# Altium footprint library 00.PcbLib: 150 footprints (part 10 of 10)
Each footprint in its own frame and in the unit in brackets; x right, y up, seen from the top. Pads: shape width x height; smd on the part's side, far side on the other; paste and mask are expansions set on the pad; w line width, h text height; cw(c..) or ccw(c..) is an arc to the next point about the centre after c.
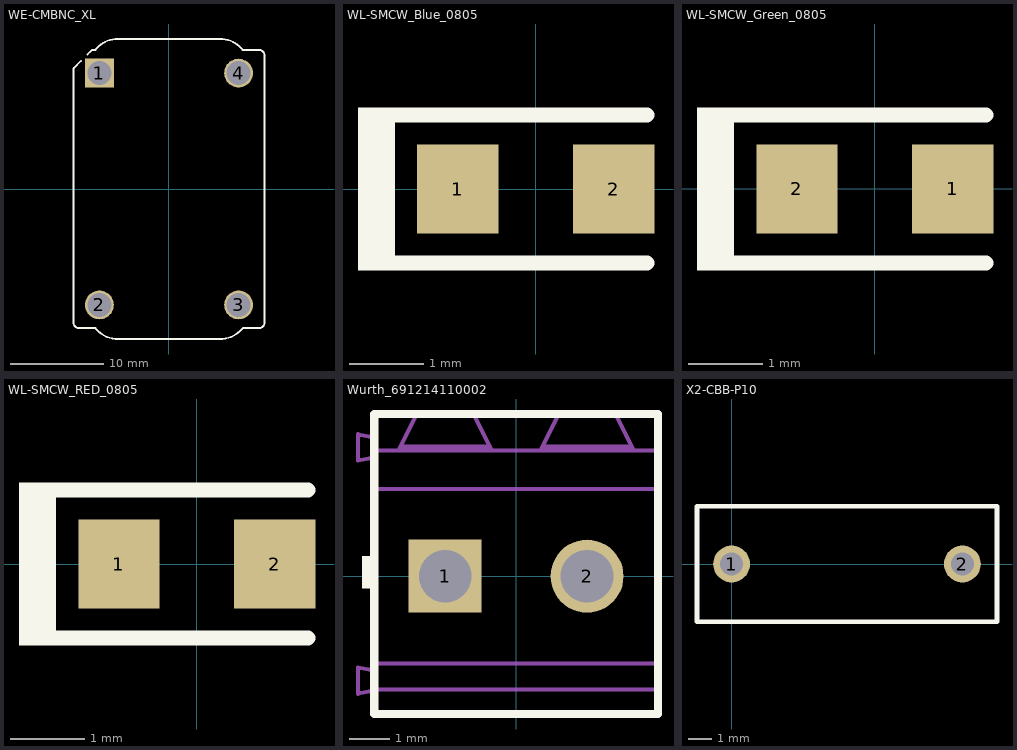
[diagram p9: the footprints below, top view; thin cyan lines are the x and y axes]

## WE-CMBNC_XL [mm]
pads (4):
  rect 3.1x3.1 hole 2.6: 1(-7.5,12.5)
  round 3.1 hole 2.6: 2(-7.5,-12.5) 3(7.5,-12.5) 4(7.5,12.5)
Top Overlay:
  lines w0.2: -9.5,13.8 -10.212,13.088 ccw(c-10,12.876) -10.3,12.876 -10.3,-14.4 ccw(c-9.7,-14.4) -9.7,-15 -7.939,-15 ; -8.8,14.5 -8.388,14.912 cw(c-8.176,14.7) -8.176,15 -7.939,15 ; -7.978,14.978 cw(c-5.531,13.066) -5.5,16.171 5.5,16.171 cw(c5.531,13.066) 7.978,14.978 ; -7.885,-15.064 ccw(c-5.513,-13.073) -5.5,-16.171 5.5,-16.171 ccw(c5.513,-13.073) 7.885,-15.064 ; 7.966,-15 9.7,-15 ccw(c9.7,-14.4) 10.3,-14.4 ; 7.966,15 9.7,15 cw(c9.7,14.4) 10.3,14.4 10.3,-14.4
3D body "7448052303.stp": height 30.09, standoff -6, extent -10.3,-16.169 10.3,16.17

## WL-SMCW_Blue_0805 [mm]
pads (2):
  rect 1.1x1.2 smd: 1(-1.05,0) 2(1.05,0)
Top Overlay:
  rectangle: -2.398,-1.1 -1.998,1.1
  lines w0.2: 1.5,-1 -2,-1 -2,1 1.5,1
3D body "WL-SMCW_0805.stp": height 0.7, standoff 0, extent -1,-0.625 1,0.625

## WL-SMCW_Green_0805 [mm]
pads (2):
  rect 1.1x1.2 smd: 1(1.05,0) 2(-1.05,0)
Top Overlay:
  rectangle: -2.4,-1.101 -2,1.099
  lines w0.2: 1.5,-1 -2,-1 -2,1 1.5,1
3D body "WL-SMCW_0805.stp": height 0.7, standoff 0, extent -1,-0.625 1,0.625

## WL-SMCW_RED_0805 [mm]
pads (2):
  rect 1.1x1.2 smd: 1(-1.05,0) 2(1.05,0)
Top Overlay:
  rectangle: -2.4,-1.1 -2,1.1
  lines w0.2: 1.5,-1 -2,-1 -2,1 1.5,1
3D body "WL-SMCW_0805.stp": height 0.7, standoff 0, extent -1,-0.625 1,0.625

## Wurth_691214110002 [mm]
pads (2):
  rect 1.8x1.8 hole 1.3: 1(-1.75,0)
  round 1.8 hole 1.3: 2(1.75,0)
Top Overlay:
  rectangle: -3.8,-0.3 -3.5,0.5
  lines w0.2: -3.5,-3.4 -3.5,-2.8 -3.5,-2.15 -3.5,2.15 -3.5,3.1 -3.5,4 -2.45,4 -1.05,4 1.05,4 2.45,4 3.5,4 3.5,3.1 3.5,2.15 3.5,-2.15 3.5,-2.8 3.5,-3.4 -3.5,-3.4
Top Component Outline (Mech100):
  lines w0.1: -3.5,-2.825 -3.9,-2.9 -3.9,-2.25 -3.5,-2.325 ; -3.5,2.925 -3.9,2.85 -3.9,3.5 -3.5,3.425 ; -2.85,3.2 -2.8,3.2 ; -2.8,3.1 -2.8,3.2 ; -2.5,3.1 -2.5,3.2 ; -1.1,3.1 -1.1,3.2 ; -0.8,3.1 -0.8,3.2 ; -0.65,3.2 -0.8,3.2 ; 0.65,3.2 0.7,3.2 ; 0.7,3.1 0.7,3.2 ; 1,3.1 1,3.2 ; 2.4,3.1 2.4,3.2 ; 2.7,3.1 2.7,3.2 ; 2.85,3.2 2.7,3.2 ; -3.5,-2.8 3.5,-2.8 ; -3.5,-2.8 -3.5,-2.15 ; -3.5,-2.8 -3.5,-3.4 3.5,-3.4 3.5,-2.8 ; -3.5,-2.15 3.5,-2.15 ; -3.5,-2.15 -3.5,2.15 ; -3.5,2.15 3.5,2.15 ; -3.5,2.15 -3.5,3.1 ; -3.5,3.1 -2.9,3.1 ; -3.5,3.1 -3.5,4 -2.45,4 ; -2.9,3.1 -0.6,3.1 ; -2.9,3.1 -2.45,4 ; -2.8,3.2 -2.6,3.2 -2.5,3.2 ; -2.5,3.2 -1.1,3.2 ; -2.45,4 -1.05,4 ; -1.1,3.2 -1,3.2 -0.8,3.2 ; -1.05,4 -0.6,3.1 ; -1.05,4 1.05,4 ; -0.6,3.1 0.6,3.1 ; 0.6,3.1 2.9,3.1 ; 0.6,3.1 1.05,4 ; 0.7,3.2 0.9,3.2 1,3.2 ; 1,3.2 2.4,3.2 ; 1.05,4 2.45,4 ; 2.4,3.2 2.5,3.2 2.7,3.2 ; 2.45,4 2.9,3.1 ; 2.45,4 3.5,4 3.5,3.1 ; 2.9,3.1 3.5,3.1 ; 3.5,-2.8 3.5,-2.15 ; 3.5,-2.15 3.5,2.15 ; 3.5,2.15 3.5,3.1
3D body "691214110002.stp": height 8.5, standoff -3.7, extent -3.9,-3.4 3.5,4

## X2-CBB-P10 [mm]
pads (2):
  round 1.6 hole 1: 1(0,0) 2(10,0)
Top Overlay:
  lines w0.2: -1.5,-2.5 11.5,-2.5 11.5,2.5 -1.5,2.5 -1.5,-2.5
3D body: height 10, standoff 0, extent -1.524,-2.54 11.557,2.54